# Altium footprint library RcMPPTLib.PcbLib: 82 footprints (part 4 of 6)
Each footprint in its own frame and in the unit in brackets; x right, y up, seen from the top. Pads: shape width x height; smd on the part's side, far side on the other; paste and mask are expansions set on the pad; w line width, h text height; cw(c..) or ccw(c..) is an arc to the next point about the centre after c.
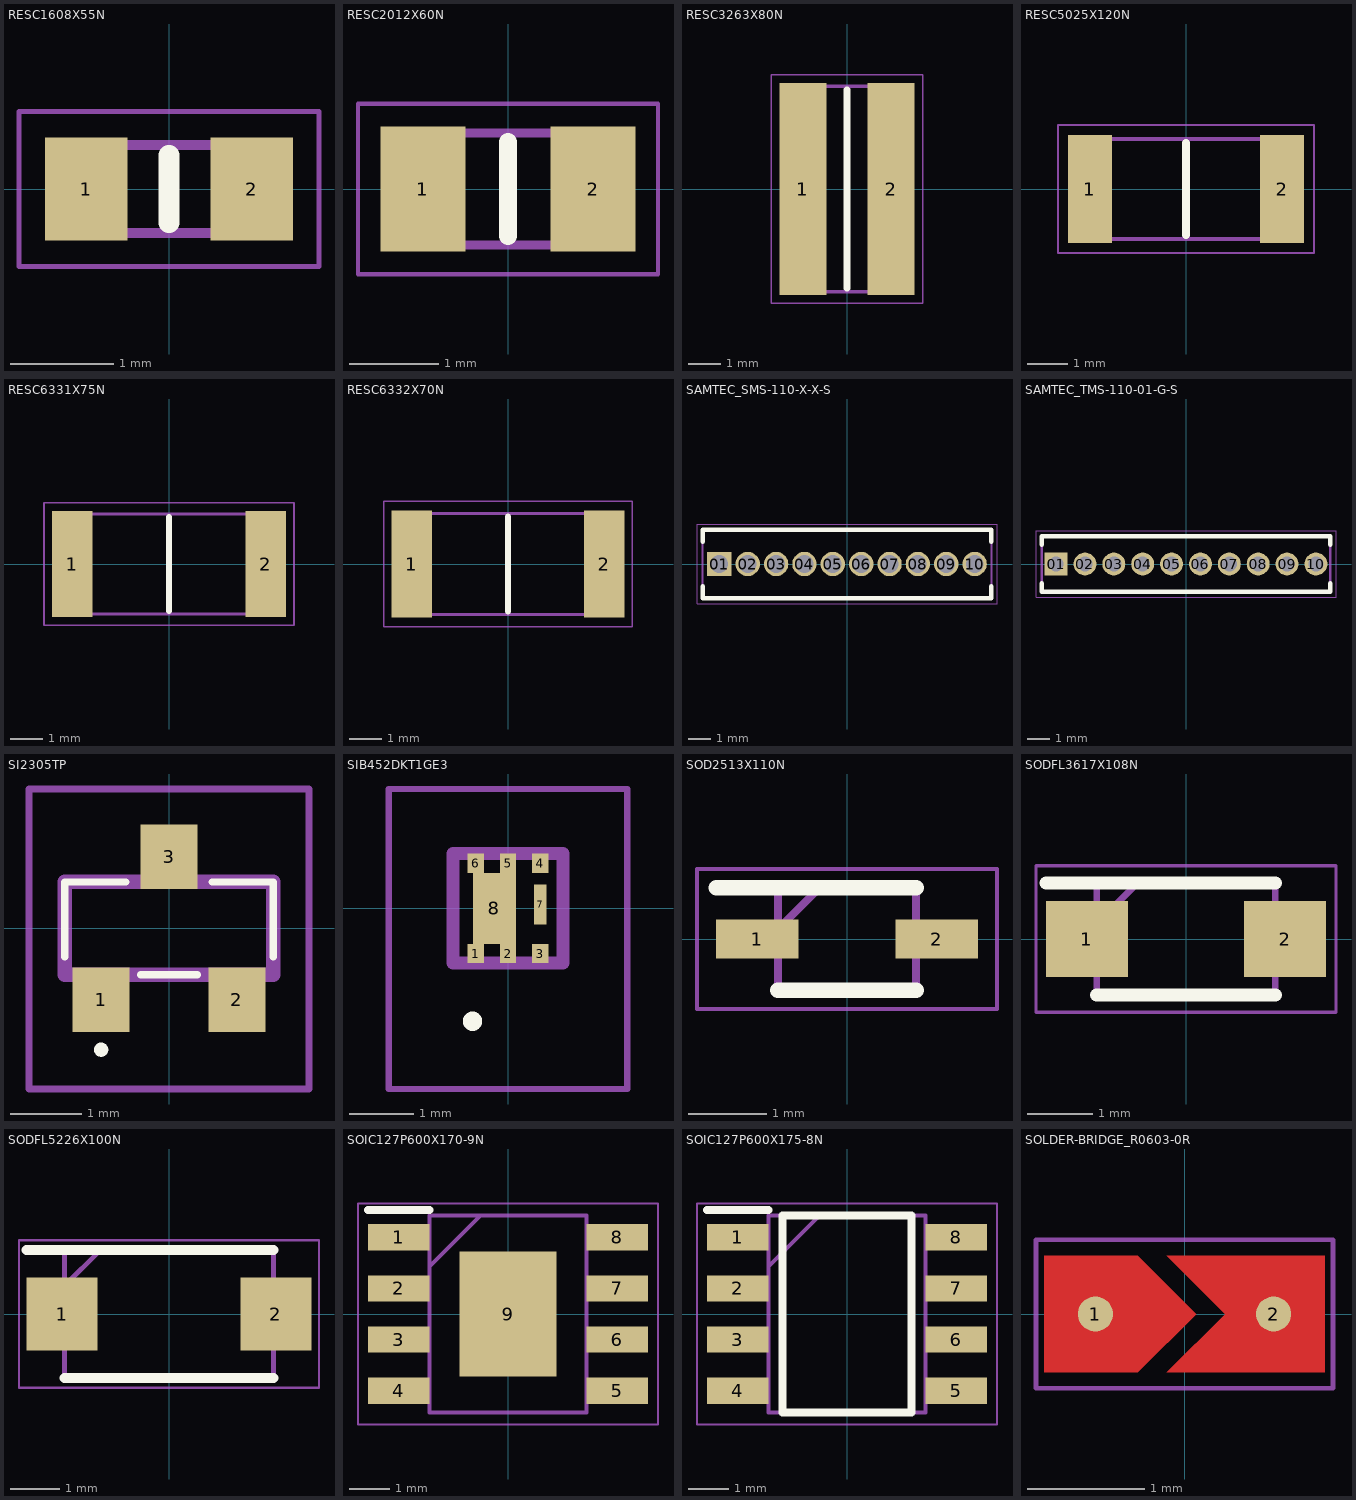
[diagram p3: the footprints below, top view; thin cyan lines are the x and y axes]

## RESC1608X55N [mm]
pads (2):
  rect 0.8x1 smd: 1(-0.8,0) 2(0.8,0)
Top Overlay:
  lines w0.2: 0,-0.325 0,0.325
Mechanical 13:
  lines w0.1: -0.775,-0.425 0.775,-0.425 0.775,0.425 -0.775,0.425 -0.775,-0.425
Mechanical 15:
  lines w0.05: -1.45,-0.75 1.45,-0.75 1.45,0.75 -1.45,0.75 -1.45,-0.75
3D body "MCT06030C1001FP500.stp": height 0.45, standoff 0, extent -0.75,-0.425 0.8,0.425

## RESC2012X60N [mm]
pads (2):
  rect 0.95x1.4 smd: 1(-0.95,0) 2(0.95,0)
Top Overlay:
  lines w0.2: 0,-0.525 0,0.525
Mechanical 13:
  lines w0.1: -1,-0.625 -1,0.625 1,0.625 1,-0.625 -1,-0.625
Mechanical 15:
  lines w0.05: -1.675,-0.95 -1.675,0.95 1.675,0.95 1.675,-0.95 -1.675,-0.95
3D body "RT0805FRE0710KL.stp": height 0.6, standoff 0, extent -1,-0.625 1,0.625

## RESC3263X80N [mm]
pads (2):
  rect 1.45x6.5 smd: 1(-1.35,0) 2(1.35,0)
Top Overlay:
  lines w0.2: 0,-3.05 0,3.05
Mechanical 13:
  lines w0.1: -1.6,-3.15 1.6,-3.15 1.6,3.15 -1.6,3.15 -1.6,-3.15
Mechanical 15:
  lines w0.05: -2.325,-3.5 2.325,-3.5 2.325,3.5 -2.325,3.5 -2.325,-3.5
3D body "RCL12254K70FKEG.stp": height 0.8, standoff 0, extent -1.6,-3.15 1.6,3.15

## RESC5025X120N [mm]
pads (2):
  rect 1.1x2.7 smd: 1(-2.4,0) 2(2.4,0)
Top Overlay:
  lines w0.2: 0,-1.15 0,1.15
Mechanical 13:
  lines w0.1: -2.5,-1.25 2.5,-1.25 2.5,1.25 -2.5,1.25 -2.5,-1.25
Mechanical 15:
  lines w0.05: -3.2,-1.6 3.2,-1.6 3.2,1.6 -3.2,1.6 -3.2,-1.6
3D body "35025K1FT.stp": height 1.2, standoff 0, extent -2.5,-1.25 2.5,1.25

## RESC6331X75N [mm]
pads (2):
  rect 1.25x3.3 smd: 1(-3,0) 2(3,0)
Top Overlay:
  lines w0.2: 0,-1.45 0,1.45
Mechanical 13:
  lines w0.1: -3.15,-1.55 -3.15,1.55 3.15,1.55 3.15,-1.55 -3.15,-1.55
Mechanical 15:
  lines w0.05: -3.875,-1.9 -3.875,1.9 3.875,1.9 3.875,-1.9 -3.875,-1.9
3D body "CR2512-JW-100ELF.stp": height 0.75, standoff 0, extent -3.15,-1.55 3.15,1.55

## RESC6332X70N [mm]
pads (2):
  rect 1.25x3.35 smd: 1(-3,0) 2(3,0)
Top Overlay:
  lines w0.2: 0,-1.475 0,1.475
Mechanical 13:
  lines w0.1: -3.15,-1.575 3.15,-1.575 3.15,1.575 -3.15,1.575 -3.15,-1.575
Mechanical 15:
  lines w0.05: -3.875,-1.95 3.875,-1.95 3.875,1.95 -3.875,1.95 -3.875,-1.95
3D body "CRCW25128K20JNEG.stp": height 0.7, standoff 0, extent -3.15,-1.575 3.15,1.575

## SAMTEC_SMS-110-X-X-S [mm]
pads (10):
  rect 1.09x1.09 hole 0.79: 01(-5.715,0)
  round 1.09 hole 0.79: 02(-4.445,0) 03(-3.175,0) 04(-1.905,0) 05(-0.635,0) 06(0.635,0) 07(1.905,0) 08(3.175,0) 09(4.445,0) 10(5.715,0)
Top Overlay:
  lines w0.2: -6.465,-1 -6.465,-1.525 6.465,-1.525 6.465,-1 ; -6.465,1 -6.465,1.525 6.465,1.525 6.465,1
Mechanical 13:
  lines w0.1: -6.465,-1.525 -6.465,1.525 6.465,1.525 6.465,-1.525 -6.465,-1.525
Mechanical 15:
  lines w0.05: -6.715,-1.775 -6.715,1.775 6.715,1.775 6.715,-1.775 -6.715,-1.775
3D body "SMS-110-01-G-S.stp": height 8.56, standoff -2.49, extent -6.464,-1.524 6.464,1.524

## SAMTEC_TMS-110-01-G-S [mm]
pads (10):
  rect 1.01x1.01 hole 0.66: 01(-5.715,0)
  round 1.01 hole 0.66: 02(-4.445,0) 03(-3.175,0) 04(-1.905,0) 05(-0.635,0) 06(0.635,0) 07(1.905,0) 08(3.175,0) 09(4.445,0) 10(5.715,0)
Top Overlay:
  lines w0.2: -6.35,-0.855 -6.35,-1.219 6.35,-1.219 6.35,-0.855 ; -6.35,0.855 -6.35,1.219 6.35,1.219 6.35,0.855
Mechanical 13:
  lines w0.1: -6.35,-1.219 6.35,-1.219 6.35,1.219 -6.35,1.219 -6.35,-1.219
Mechanical 15:
  lines w0.05: -6.6,-1.469 -6.6,1.469 6.6,1.469 6.6,-1.469 -6.6,-1.469
3D body "TMS-110-01-G-S.stp": height 8.43, standoff -3, extent -6.35,-1.219 6.35,1.219

## SI2305TP [mm]
pads (3):
  rect 0.8x0.9 smd: 1(-0.95,-1) 2(0.95,-1) 3(0,1)
Top Overlay:
  lines w0.1: -1.46,-0.4 -1.46,0.65 -0.6,0.65 ; -0.4,-0.65 0.4,-0.65 ; 0.6,0.65 1.46,0.65 1.46,-0.4 ; -1,-1.7 cw(c-0.95,-1.7) -0.9,-1.7 cw(c-0.95,-1.7) -1,-1.7
Mechanical 13:
  lines w0.2: -1.46,-0.65 1.46,-0.65 1.46,0.65 -1.46,0.65 -1.46,-0.65
Mechanical 15:
  lines w0.1: -1.96,-2.25 1.96,-2.25 1.96,1.95 -1.96,1.95 -1.96,-2.25
3D body "SI2324A-TP.stp": height 0.89, standoff -0.01, extent -1.4,-1.05 1.4,1.05

## SIB452DKT1GE3 [mm]
pads (8):
  rect 0.25x0.3 smd: 1(-0.5,-0.7) 2(0,-0.7) 3(0.5,-0.7) 4(0.5,0.7) 5(0,0.7) 6(-0.5,0.7)
  rect 0.2x0.62 smd: 7(0.5,0.06)
  rect 0.67x1.1 smd: 8(-0.21,0)
Top Overlay:
  lines w0.2: -0.6,-1.75 ccw(c-0.55,-1.75) -0.5,-1.75 ; -0.6,-1.75 cw(c-0.55,-1.75) -0.5,-1.75 ; -0.6,-1.75 ccw(c-0.55,-1.75) -0.5,-1.75
Mechanical 13:
  lines w0.2: -0.85,-0.85 -0.85,0.85 0.85,0.85 0.85,-0.85 -0.85,-0.85
Mechanical 15:
  lines w0.1: -1.85,-2.8 -1.85,1.85 1.85,1.85 1.85,-2.8 -1.85,-2.8
3D body "SIB452DK-T1-GE3.stp": height 0.9, standoff 0, extent -0.85,-0.85 0.85,0.85

## SOD2513X110N [mm]
pads (2):
  rect 1.05x0.5 smd: 1(-1.138,0) 2(1.138,0)
Top Overlay:
  lines w0.2: -1.662,0.65 0.875,0.65 ; -0.875,-0.65 0.875,-0.65
Mechanical 13:
  lines w0.1: -0.875,0.125 -0.35,0.65 ; -0.875,-0.65 0.875,-0.65 0.875,0.65 -0.875,0.65 -0.875,-0.65
Mechanical 15:
  lines w0.05: -1.905,-0.889 1.905,-0.889 1.905,0.889 -1.905,0.889 -1.905,-0.889
3D body "BAS3010A03WE6327HTSA1.stp": height 1.1, standoff 0, extent -1.25,-0.65 1.25,0.65

## SODFL3617X108N [mm]
pads (2):
  rect 1.26x1.17 smd: 1(-1.525,0) 2(1.525,0)
Top Overlay:
  lines w0.2: -2.155,0.862 1.375,0.862 ; -1.375,-0.862 1.375,-0.862
Mechanical 13:
  lines w0.1: -1.375,0.232 -0.745,0.862 ; -1.375,-0.862 -1.375,0.862 1.375,0.862 1.375,-0.862 -1.375,-0.862
Mechanical 15:
  lines w0.05: -2.305,-1.125 -2.305,1.125 2.305,1.125 2.305,-1.125 -2.305,-1.125
3D body "MBR1020VL.stp": height 1.08, standoff 0, extent -1.8,-0.863 1.8,0.863

## SODFL5226X100N [mm]
pads (2):
  rect 1.45x1.49 smd: 1(-2.175,0) 2(2.175,0)
Top Overlay:
  lines w0.2: -2.9,1.3 2.125,1.3 ; -2.125,-1.3 2.125,-1.3
Mechanical 13:
  lines w0.1: -2.125,0.575 -1.4,1.3 ; -2.125,-1.3 2.125,-1.3 2.125,1.3 -2.125,1.3 -2.125,-1.3
Mechanical 15:
  lines w0.05: -3.05,-1.5 3.05,-1.5 3.05,1.5 -3.05,1.5 -3.05,-1.5
3D body "VSSAF3M10-M3_H.stp": height 1, standoff 0, extent -2.6,-1.3 2.6,1.3

## SOIC127P600X170-9N [mm]
pads (9):
  rect 1.525x0.65 smd: 1(-2.712,1.905) 2(-2.712,0.635) 3(-2.712,-0.635) 4(-2.712,-1.905) 5(2.712,-1.905) 6(2.712,-0.635) 7(2.712,0.635) 8(2.712,1.905)
  rect 2.4x3.1 smd: 9(0,0)
Top Overlay:
  lines w0.2: -3.475,2.58 -1.95,2.58
Mechanical 13:
  lines w0.1: -1.95,1.18 -0.68,2.45 ; -1.95,-2.45 1.95,-2.45 1.95,2.45 -1.95,2.45 -1.95,-2.45
Mechanical 15:
  lines w0.05: -3.725,-2.75 3.725,-2.75 3.725,2.75 -3.725,2.75 -3.725,-2.75
3D body "UCC27212AQDDARQ1.stp": height 1.7, standoff 0, extent -3,-2.45 3,2.45

## SOIC127P600X175-8N [mm]
pads (8):
  rect 1.525x0.65 smd: 1(-2.712,1.905) 2(-2.712,0.635) 3(-2.712,-0.635) 4(-2.712,-1.905) 5(2.712,-1.905) 6(2.712,-0.635) 7(2.712,0.635) 8(2.712,1.905)
Top Overlay:
  lines w0.2: -3.475,2.58 -1.95,2.58 ; -1.6,-2.45 1.6,-2.45 1.6,2.45 -1.6,2.45 -1.6,-2.45
Mechanical 13:
  lines w0.1: -1.95,1.18 -0.68,2.45 ; -1.95,-2.45 1.95,-2.45 1.95,2.45 -1.95,2.45 -1.95,-2.45
Mechanical 15:
  lines w0.05: -3.725,-2.75 3.725,-2.75 3.725,2.75 -3.725,2.75 -3.725,-2.75
3D body "LM393ADT.stp": height 1.75, standoff 0, extent -3,-2.45 3,2.45

## SOLDER-BRIDGE_R0603-0R [mm]
height 0.5
pads (2):
  round 0.3 smd: 1(-0.762,0) 2(0.762,0)
Top Layer:
  region: -1.2,0.5 -1.2,-0.5 -0.4,-0.5 0.1,0 -0.4,0.5
  region: -0.15,-0.5 0.35,0 -0.15,0.5 1.2,0.5 1.2,-0.5
Top Solder:
  region: 0.305,0 -0.245,-0.55 1.295,-0.55 1.295,0.55 -0.245,0.55
  region: -1.27,-0.55 -0.398,-0.55 0.152,0 -0.398,0.55 -1.27,0.55
Mechanical 15:
  lines w0.04: -1.27,-0.635 1.27,-0.635 1.27,0.635 -1.27,0.635 -1.27,-0.635
3D body: height 0.5, standoff 0, extent -0.905,-0.505 0.905,0.505